# Altium footprint library ARCOM_Connectors.PcbLib: 84 footprints (part 3 of 6)
Each footprint in its own frame and in the unit in brackets; x right, y up, seen from the top. Pads: shape width x height; smd on the part's side, far side on the other; paste and mask are expansions set on the pad; w line width, h text height; cw(c..) or ccw(c..) is an arc to the next point about the centre after c.
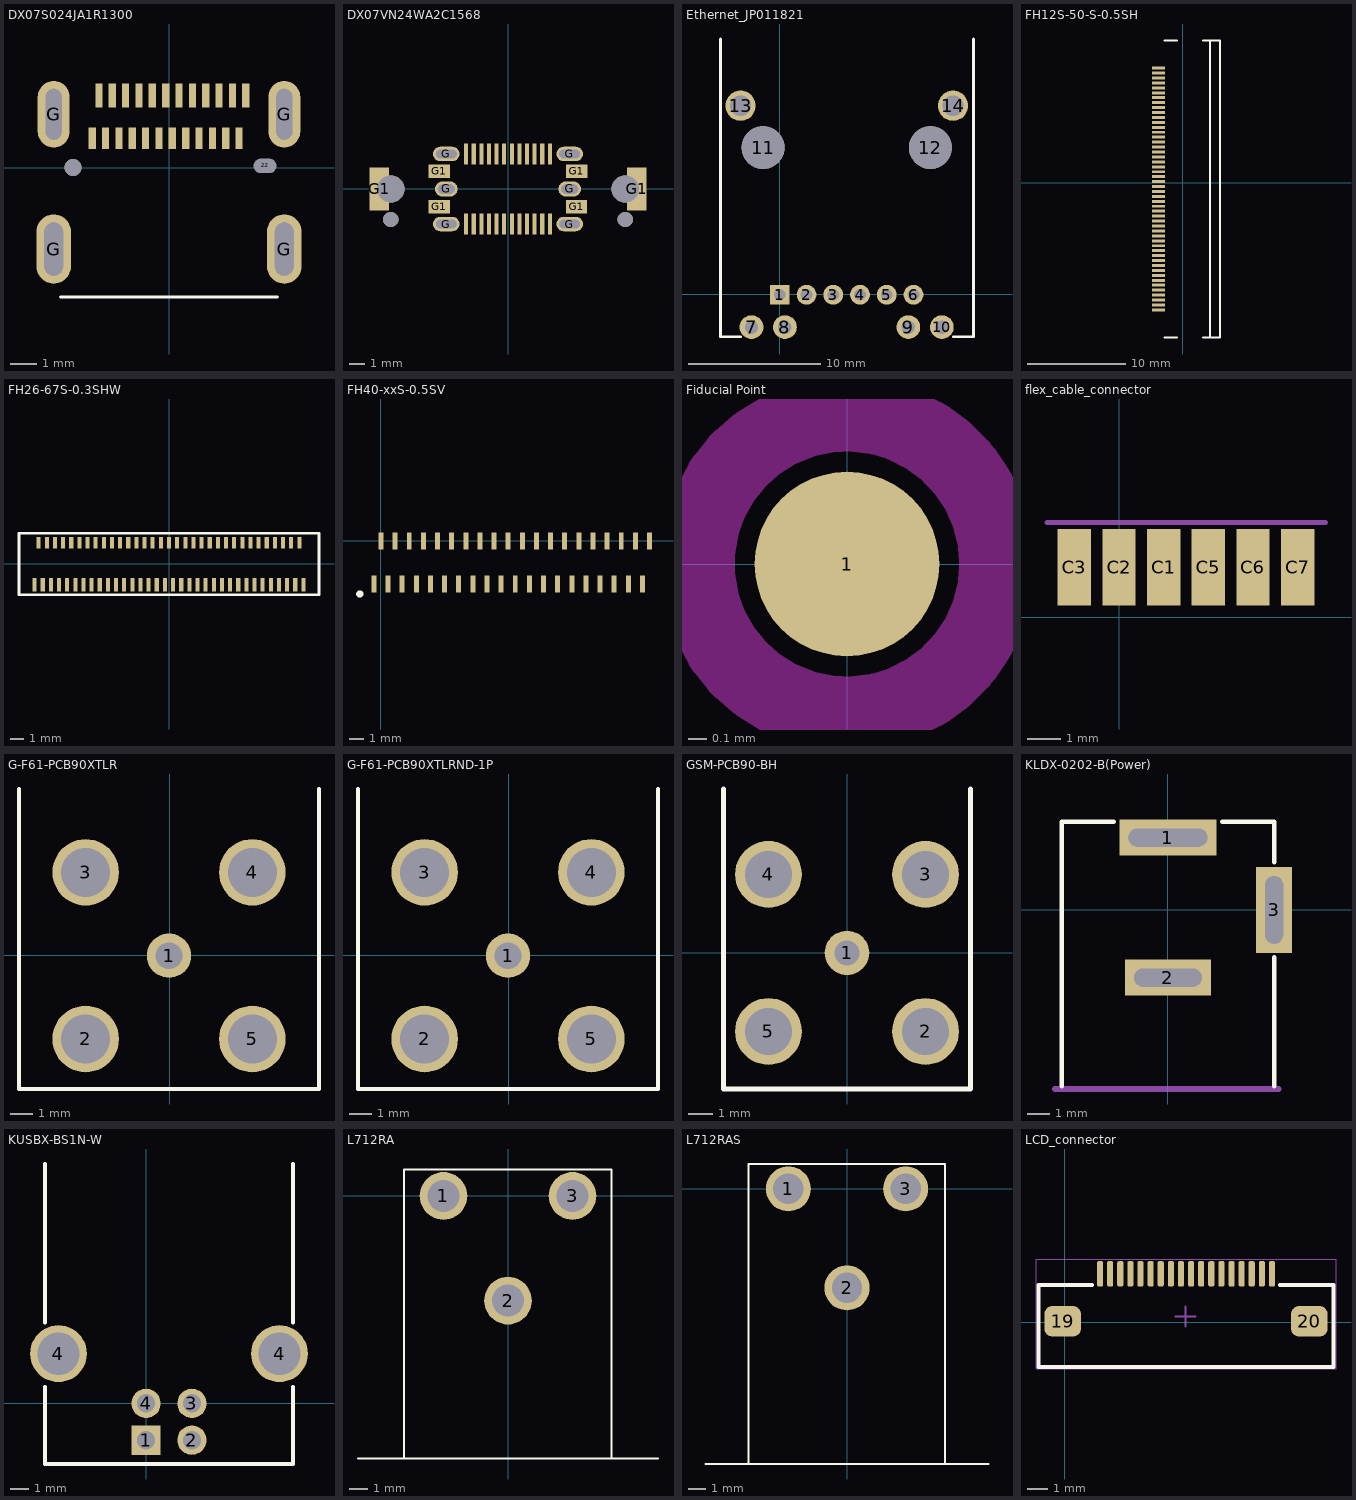
[diagram p2: the footprints below, top view; thin cyan lines are the x and y axes]

## DX07S024JA1R1300 [mm]
pads (29):
  rect 0.27x0.9 smd: A1(-2.625,2.7) A2(-2.125,2.7) A3(-1.625,2.7) A4(-1.125,2.7) A5(-0.625,2.7) A6(-0.125,2.7) A7(0.375,2.7) A8(0.875,2.7) A9(1.375,2.7) A10(1.875,2.7) A11(2.375,2.7) A12(2.875,2.7)
  rect 0.27x0.8 smd: B1(2.625,1.1) B2(2.125,1.1) B3(1.625,1.1) B4(1.125,1.1) B5(0.625,1.1) B6(0.125,1.1) B7(-0.375,1.1) B8(-0.875,1.1) B9(-1.375,1.1) B10(-1.875,1.1) B11(-2.375,1.1) B12(-2.875,1.1)
  rrect100% 1.3x2.6 hole 0.7 slot 2 at 90 deg: G(-4.32,-3.05) G(4.32,-3.05)
  rrect100% 1.2x2.5 hole 0.6 slot 1.9 at 90 deg: G(-4.32,2) G(4.32,2)
  round 0.381 hole 0.53 slot 0.85 at 0 deg paste+0 mask-0.102: zz(3.6,0.065)
via -3.6,0 diameter 0.63 hole 0.63
Top Overlay:
  lines w0.102: -4.064,-4.85 4.064,-4.85
3D body "K3D-DX07S024JA1-V3_JAE_Proprietary.STEP": height 3.2, standoff -0.54, extent -4.47,-5.36 4.47,2.81

## DX07VN24WA2C1568 [mm]
pads (36):
  rect 0.27x1.4 smd: A1(2.75,2.3) A2(2.25,2.3) A3(1.75,2.3) A4(1.25,2.3) A5(0.75,2.3) A6(0.25,2.3) A7(-0.25,2.3) A8(-0.75,2.3) A9(-1.25,2.3) A10(-1.75,2.3) A11(-2.25,2.3) A12(-2.75,2.3) B1(-2.75,-2.3) B2(-2.25,-2.3) B3(-1.75,-2.3) B4(-1.25,-2.3) B5(-0.75,-2.3) B6(-0.25,-2.3) B7(0.25,-2.3) B8(0.75,-2.3) B9(1.25,-2.3) B10(1.75,-2.3) B11(2.25,-2.3) B12(2.75,-2.3)
  rrect100% 1.75x0.95 hole 0.55 slot 1.35 at 0 deg: G(-4.05,-2.3) G(-4.05,2.3) G(4.05,-2.3) G(4.05,2.3)
  rrect100% 1.5x1 hole 0.6 slot 1.1 at 0 deg: G(-4.05,0) G(4.05,0)
  rect 1.3x2.8 smd: G1(-8.45,0) G1(8.45,0)
  rect 1.4x0.9 smd: G1(-4.511,-1.175) G1(-4.505,1.175) G1(4.5,-1.175) G1(4.505,1.175)
via 7.7,-2 diameter 1 hole 1
via -7.7,-2 diameter 1 hole 1
via 7.7,0 diameter 1.8 hole 1.8
via -7.7,0 diameter 1.8 hole 1.8
3D body "K3D-DX07VN24WA2-V2_JAE_Proprietary.SLDPRT": height 12.6, standoff -1.2, extent -9.205,-2.7 9.195,2.7

## Ethernet_JP011821 [mm]
pads (14):
  rect 1.5x1.5 hole 0.89: 1(0,-0.025)
  round 1.5 hole 0.89: 2(2.03,-0.025) 3(4.06,-0.025) 4(6.09,-0.025) 5(8.12,-0.025) 6(10.15,-0.025)
  round 1.8 hole 1.02: 7(-2.15,-2.485) 8(0.39,-2.485) 9(9.76,-2.485) 10(12.3,-2.485)
  round 3.25 hole 3.25 unplated: 11(-1.27,11.145) 12(11.43,11.145)
  round 2.3 hole 1.57: 13(-2.98,14.325) 14(13.15,14.325)
Top Overlay:
  lines w0.2: -4.5,19.39 -4.5,-3.21 -2.99,-3.21 ; 13.17,-3.21 14.7,-3.21 14.7,19.39
3D body "User Library-08B0-1X1T-36-F_.STEP": height 15.61, standoff -3.26, extent -5.34,-3.785 15.449,22.285

## FH12S-50-S-0.5SH [mm]
pads (50):
  rect 1.3x0.3 smd: 1(-2.469,-12.89) 2(-2.469,-12.39) 3(-2.469,-11.89) 4(-2.469,-11.39) 5(-2.469,-10.89) 6(-2.469,-10.39) 7(-2.469,-9.89) 8(-2.469,-9.39) 9(-2.469,-8.89) 10(-2.469,-8.39) 11(-2.469,-7.89) 12(-2.469,-7.39) 13(-2.469,-6.89) 14(-2.469,-6.39) 15(-2.469,-5.89) 16(-2.469,-5.39) 17(-2.469,-4.89) 18(-2.469,-4.39) 19(-2.469,-3.89) 20(-2.469,-3.39) 21(-2.469,-2.89) 22(-2.469,-2.39) 23(-2.469,-1.89) 24(-2.469,-1.39) 25(-2.469,-0.89) 26(-2.469,-0.39) 27(-2.469,0.11) 28(-2.469,0.61) 29(-2.469,1.11) 30(-2.469,1.61) 31(-2.469,2.11) 32(-2.469,2.61) 33(-2.469,3.11) 34(-2.469,3.61) 35(-2.469,4.11) 36(-2.469,4.61) 37(-2.469,5.11) 38(-2.469,5.61) 39(-2.469,6.11) 40(-2.469,6.61) 41(-2.469,7.11) 42(-2.469,7.61) 43(-2.469,8.11) 44(-2.469,8.61) 45(-2.469,9.11) 46(-2.469,9.61) 47(-2.469,10.11) 48(-2.469,10.61) 49(-2.469,11.11) 50(-2.469,11.61)
Top Overlay:
  lines w0.2: -1.839,-15.69 -0.589,-15.69 ; -1.839,14.41 -0.589,14.41 ; 2.061,-15.69 3.781,-15.69 3.781,14.41 2.061,14.41 ; 2.781,-15.69 2.781,14.41
Top Paste:
  region: -0.319,14.41 -0.319,12.61 1.881,12.61 1.881,14.41
  region: -0.319,-13.89 -0.319,-15.69 1.881,-15.69 1.881,-13.89
Top Solder:
  region: -0.469,14.56 -0.469,12.46 2.031,12.46 2.031,14.56
  region: -0.469,-13.74 -0.469,-15.84 2.031,-15.84 2.031,-13.74
3D body "FH12S-50S-0.5SH.stp": height 2.41, standoff 0.01, extent -2.642,-15.185 3.758,13.915

## FH26-67S-0.3SHW [mm]
pads (67):
  rect 0.3x1 smd: 1(-9.9,-1.55) 3(-9.3,-1.55) 5(-8.7,-1.55) 7(-8.1,-1.55) 9(-7.5,-1.55) 11(-6.9,-1.55) 13(-6.3,-1.55) 15(-5.7,-1.55) 17(-5.1,-1.55) 19(-4.5,-1.55) 21(-3.9,-1.55) 23(-3.3,-1.55) 25(-2.7,-1.55) 27(-2.1,-1.55) 29(-1.5,-1.55) 31(-0.9,-1.55) 33(-0.3,-1.55) 35(0.3,-1.55) 37(0.9,-1.55) 39(1.5,-1.55) 41(2.1,-1.55) 43(2.7,-1.55) 45(3.3,-1.55) 47(3.9,-1.55) 49(4.5,-1.55) 51(5.1,-1.55) 53(5.7,-1.55) 55(6.3,-1.55) 57(6.9,-1.55) 59(7.5,-1.55) 61(8.1,-1.55) 63(8.7,-1.55) 65(9.3,-1.55) 67(9.9,-1.55)
  rect 0.3x0.85 smd: 2(-9.6,1.55) 4(-9,1.55) 6(-8.4,1.55) 8(-7.8,1.55) 10(-7.2,1.55) 12(-6.6,1.55) 14(-6,1.55) 16(-5.4,1.55) 18(-4.8,1.55) 20(-4.2,1.55) 22(-3.6,1.55) 24(-3,1.55) 26(-2.4,1.55) 28(-1.8,1.55) 30(-1.2,1.55) 32(-0.6,1.55) 34(0,1.55) 36(0.6,1.55) 38(1.2,1.55) 40(1.8,1.55) 42(2.4,1.55) 44(3,1.55) 46(3.6,1.55) 48(4.2,1.55) 50(4.8,1.55) 52(5.4,1.55) 54(6,1.55) 56(6.6,1.55) 58(7.2,1.55) 60(7.8,1.55) 62(8.4,1.55) 64(9,1.55) 66(9.6,1.55)
Top Overlay:
  lines w0.2: -11.05,-2.3 -11.05,2.25 11.05,2.25 11.05,-2.3 -11.05,-2.3

## FH40-xxS-0.5SV [mm]
height 5.8
pads (40):
  rect 0.35x1.2 smd: 1(-0.5,-3.05) 2(0,0) 3(0.5,-3.05) 4(1,0) 5(1.5,-3.05) 6(2,0) 7(2.5,-3.05) 8(3,0) 9(3.5,-3.05) 10(4,0) 11(4.5,-3.05) 12(5,0) 13(5.5,-3.05) 14(6,0) 15(6.5,-3.05) 16(7,0) 17(7.5,-3.05) 18(8,0) 19(8.5,-3.05) 20(9,0) 21(9.5,-3.05) 22(10,0) 23(10.5,-3.05) 24(11,0) 25(11.5,-3.05) 26(12,0) 27(12.5,-3.05) 28(13,0) 29(13.5,-3.05) 30(14,0) 31(14.5,-3.05) 32(15,0) 33(15.5,-3.05) 34(16,0) 35(16.5,-3.05) 36(17,0) 37(17.5,-3.05) 38(18,0) 39(18.5,-3.05) 40(19,0)
Top Overlay:
  circle w0.254: c-1.499,-3.759 r0.127
3D body "fh40-40s-0_5sv.STEP": height 5.81, standoff 0.01, extent -2.329,-3.327 20.871,1.573

## Fiducial Point [mm]
pads (1):
  round 1 smd paste-0.508: 1(0,0)
Top Layer keep-out:
  circle w0.406: c0,0 r0.813

## flex_cable_connector [mm] "flex cable connector"
pads (6):
  rect 1x2.3 smd: C1(1.34,1.499) C2(0,1.499) C3(-1.34,1.499) C5(2.68,1.499) C6(4.02,1.499) C7(5.36,1.499)
Mechanical 13:
  lines w0.152: -2.159,2.845 6.198,2.845
  text "Board Edge" at -1.854,3.048 h0.25

## G-F61-PCB90XTLR [mm]
pads (5):
  round 2 hole 1.2: 1(-0.025,-0.025)
  round 3 hole 2.2: 2(-3.775,-3.775) 3(-3.775,3.725) 4(3.725,3.725) 5(3.725,-3.775)
Top Overlay:
  lines w0.2: -6.775,7.475 -6.775,-6.025 6.725,-6.025 6.725,7.475
3D body "G-F61-PCB90XTLR.STEP": height 12.55, standoff -2.45, extent -5.687,-5.797 5.613,27.203

## G-F61-PCB90XTLRND-1P [mm]
pads (5):
  round 2 hole 1.2: 1(-0.025,-0.025)
  round 3 hole 2.2: 2(-3.775,-3.775) 3(-3.775,3.725) 4(3.725,3.725) 5(3.725,-3.775)
Top Overlay:
  lines w0.2: -6.775,7.475 -6.775,-6.025 6.725,-6.025 6.725,7.475
3D body "G-F61-PCB90XTLRND-1P.STEP": height 12.13, standoff -2.87, extent -5.512,-5.503 5.488,27.397

## GSM-PCB90-BH [mm]
pads (5):
  round 1.8 hole 1: 1(0,0)
  round 2.7 hole 1.9: 2(3.175,-3.175) 3(3.175,3.175) 4(-3.175,3.175) 5(-3.175,-3.175)
Top Overlay:
  lines w0.2: -5,6.625 -5,-5.5 5,-5.5 5,6.625
3D body "GSM-PCB90-BH.STEP": height 11.06, standoff -3.09, extent -7.518,-5.405 7.482,20.595

## KLDX-0202-B(Power) [mm]
pads (3):
  rect 4.3x1.6 hole 0.8 slot 3.5 at 0 deg: 1(0,3.2)
  rect 3.8x1.6 hole 0.8 slot 3 at 0 deg: 2(0,-3)
  rect 1.6x3.8 hole 0.8 slot 3 at 90 deg: 3(4.7,0)
Top Overlay:
  lines w0.2: -4.7,-7.8 -4.7,3.9 -2.4,3.9 ; 2.4,3.9 4.7,3.9 4.7,2.1 ; 4.7,-7.8 4.7,-2.1
Mechanical 1:
  region: -1.75,3.6 -1.75,2.8 1.75,2.8 1.75,3.6
  region: -1.5,-3.4 1.5,-3.4 1.5,-2.6 -1.5,-2.6
  region: 4.3,1.5 4.3,-1.5 5.1,-1.5 5.1,1.5
  lines w0.254: -5.001,-7.927 4.899,-7.927
3D body "KLDX-0202-B_rD3.STEP": height 10.8, standoff -4.1, extent -4.525,-10.693 4.875,3.807

## KUSBX-BS1N-W [mm]
pads (6):
  rect 1.6x1.6 hole 1: 1(0,-2)
  round 1.6 hole 1: 2(2.5,-2) 3(2.5,0) 4(0,0)
  round 3.1 hole 2.3: 4(-4.77,2.71) 4(7.27,2.71)
Top Overlay:
  lines w0.2: -5.5,0.9 -5.5,-3.3 8,-3.3 8,0.9 ; -5.5,4.4 -5.5,13.04 ; 8,4.4 8,13.04
3D body "USB-B_5879.STEP": height 11.04, standoff -4.18, extent -6.185,-4.027 8.675,12.973

## L712RA [mm]
pads (3):
  round 2.54 hole 1.7: 1(-3.43,0) 2(0,-5.57) 3(3.43,0)
Top Overlay:
  lines w0.102: -7.976,-13.956 7.976,-13.956 ; -5.537,-13.945 -5.537,1.397 5.512,1.397 5.512,-13.945
3D body "L712RA_new.SLDPRT": height 14.02, standoff -3.43, extent -5.512,-21.91 5.51,1.438

## L712RAS [mm]
pads (3):
  round 2.54 hole 1.7: 1(-3.3,0) 2(0,-5.57) 3(3.3,0)
Top Overlay:
  lines w0.102: -7.976,-15.48 7.976,-15.48 ; -5.537,-15.48 -5.537,1.397 5.512,1.397 5.512,-15.48
3D body "User Library-switchcraft L722RA.STEP": height 13.89, standoff -3.17, extent -5.512,-21.947 5.512,1.373

## LCD_connector [mm]
pads (20):
  rrect50% 0.3x1.25 smd mask+0.051: 1(1.744,2.394) 2(2.244,2.394) 3(2.744,2.394) 4(3.244,2.394) 5(3.744,2.394) 6(4.244,2.394) 7(4.744,2.394) 8(5.244,2.394) 9(5.744,2.394) 10(6.244,2.394) 11(6.744,2.394) 12(7.244,2.394) 13(7.744,2.394) 14(8.244,2.394) 15(8.744,2.394) 16(9.244,2.394) 17(9.744,2.394) 18(10.244,2.394)
  rrect50% 1.8x1.5 smd: 19(-0.106,0.044) 20(12.094,0.044)
Top Overlay:
  lines w0.2: 1.344,1.844 -1.306,1.844 -1.306,-2.206 13.294,-2.206 13.294,1.844 10.644,1.844
M15 Top Assy:
  lines w0.05: -1.422,-2.311 13.411,-2.311 13.411,3.124 -1.422,3.124 -1.422,-2.311
  lines w0.1: 5.469,0.279 6.469,0.279 ; 5.969,-0.221 5.969,0.779